# Altium footprint library 电阻封装库.PcbLib: 218 footprints (part 10 of 14)
Each footprint in its own frame and in the unit in brackets; x right, y up, seen from the top. Pads: shape width x height; smd on the part's side, far side on the other; paste and mask are expansions set on the pad; w line width, h text height; cw(c..) or ccw(c..) is an arc to the next point about the centre after c.
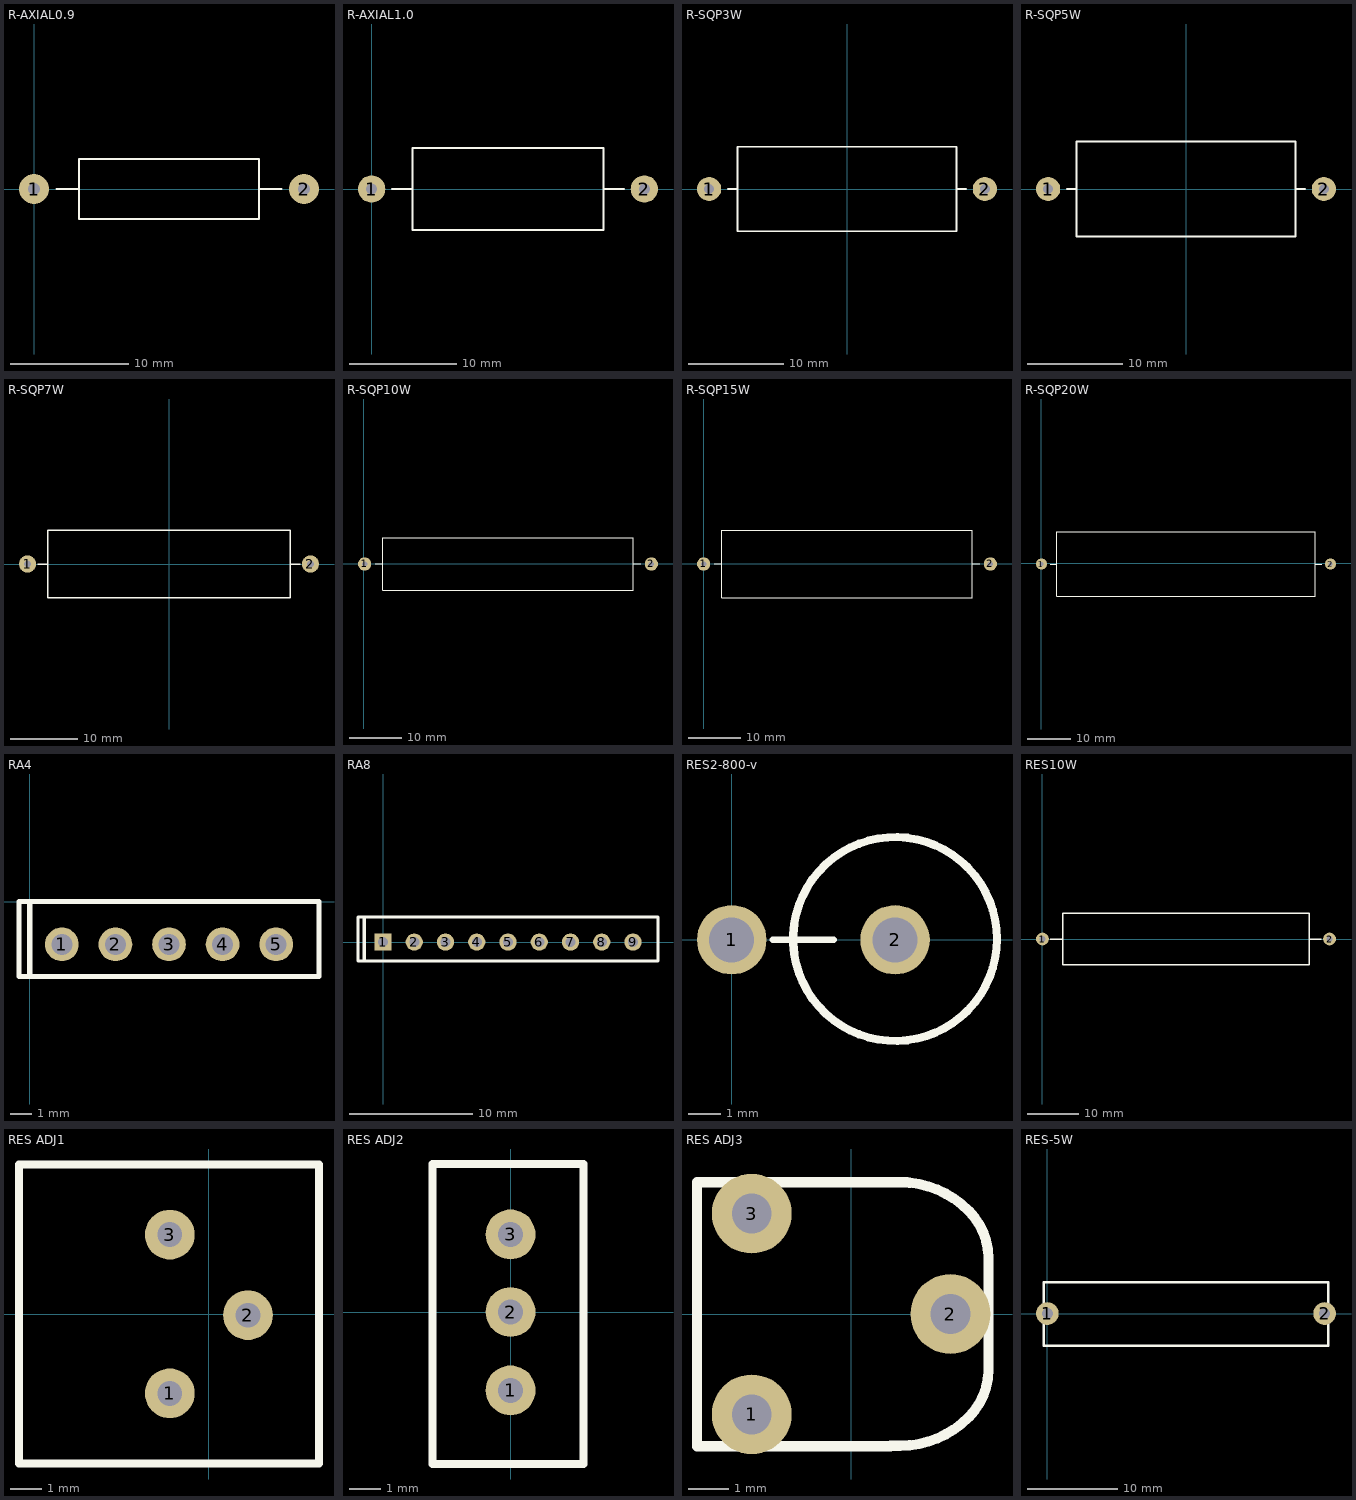
[diagram p9: the footprints below, top view; thin cyan lines are the x and y axes]

## R-AXIAL0.9 [mil]
pads (2):
  round 100 hole 40: 1(0,0) 2(900,0)
Top Overlay:
  lines w8: 75,0 150,0 ; 750,0 825,0 ; 150,-100 150,100 750,100 750,-100 150,-100

## R-AXIAL1.0 [mil]
pads (2):
  round 100 hole 40: 1(0,0) 2(1000,0)
Top Overlay:
  lines w8: 75,0 150,0 ; 850,0 925,0 ; 150,-150 150,150 850,150 850,-150 150,-150

## R-SQP3W [mm]
pads (2):
  round 2.54 hole 1.016: 1(-14.5,0) 2(14.5,0)
Top Overlay:
  lines w0.203: -12.5,0 -11.5,0 ; 11.5,0 12.5,0 ; -11.5,-4.445 11.5,-4.445 11.5,4.445 -11.5,4.445 -11.5,-4.445

## R-SQP5W [mm]
pads (2):
  round 2.54 hole 1.016: 1(-14.5,0) 2(14.5,0)
Top Overlay:
  lines w0.203: -12.5,0 -11.5,0 ; 11.5,0 12.5,0 ; -11.5,-5 -11.5,5 11.5,5 11.5,-5 -11.5,-5

## R-SQP7W [mm]
pads (2):
  round 2.54 hole 1.016: 1(-21,0) 2(21,0)
Top Overlay:
  lines w0.203: -19.5,0 -18,0 ; 18,0 19.5,0 ; -18,-5 18,-5 18,5 -18,5 -18,-5

## R-SQP10W [mil]
pads (2):
  round 100 hole 40: 1(4.82,-2.5) 2(2170.18,-2.5)
Top Overlay:
  lines w8: 83.56,-2.5 142.62,-2.5 ; 2032.38,-2.5 2091.44,-2.5 ; 142.62,-199.35 142.62,194.35 2032.38,194.35 2032.38,-199.35 142.62,-199.35

## R-SQP15W [mil]
pads (2):
  round 100 hole 40: 1(-0.18,-2.5) 2(2165.18,-2.5)
Top Overlay:
  lines w8: 78.56,-2.5 137.62,-2.5 ; 2027.38,-2.5 2086.44,-2.5 ; 137.62,-258.41 137.62,253.41 2027.38,253.41 2027.38,-258.41 137.62,-258.41

## R-SQP20W [mil]
pads (2):
  round 100 hole 40: 1(3.6,-5) 2(2641.4,-5)
Top Overlay:
  lines w8: 82.34,-5 141.4,-5 ; 2503.6,-5 2562.66,-5 ; 141.4,-300.28 141.4,290.28 2503.6,290.28 2503.6,-300.28 141.4,-300.28

## RA4 [mm]
height 0.6
pads (5):
  round 1.6 hole 1: 1(1.524,-2.032) 2(4.064,-2.032) 3(6.604,-2.032) 4(9.144,-2.032) 5(11.684,-2.032)
Top Overlay:
  lines w0.254: 0,-3.556 0,0 ; -0.508,-3.556 13.716,-3.556 13.716,0 -0.508,0 -0.508,-0.508 -0.508,-3.556
3D body "RA4.STEP": height 3.5, standoff -3, extent 0.254,-2.656 12.954,-1.256

## RA8 [mm]
height 0.6
pads (9):
  rect 1.4x1.4 hole 0.813: 1(0,0)
  round 1.4 hole 0.813: 2(2.54,0) 3(5.08,0) 4(7.62,0) 5(10.16,0) 6(12.7,0) 7(15.24,0) 8(17.78,0) 9(20.32,0)
Top Overlay:
  lines w0.254: -1.524,-1.524 -1.524,2.032 ; -2.032,-1.524 22.352,-1.524 22.352,2.032 -2.032,2.032 -2.032,1.524 -2.032,-1.524
3D body "RA8.STEP": height 3.5, standoff -2, extent -1.194,-0.6 21.666,0.6

## RES2-800-v [mil]
pads (2):
  round 85 / inner round 85 / far side round 70 hole 55.12: 1(0,0) 2(200,0)
Top Overlay:
  circle w10: c200,1 r124.78
  lines w8: 50,0 125,0

## RES10W [mm]
pads (2):
  round 2.5 hole 1.2: 1(0,0) 2(56,0)
Top Overlay:
  lines w0.254: 1.524,0 4,0 ; 52,0 54.356,0 ; 4,-5 4,5 52,5 52,-5 4,-5

## RES ADJ1 [mm]
pads (3):
  round 1.6 hole 0.8: 1(-1.257,-2.553) 2(1.257,-0.038) 3(-1.257,2.553)
Top Overlay:
  lines w0.254: -6.109,-4.813 3.543,-4.813 3.543,4.813 -6.109,4.813 -6.109,-4.813
3D body "RES ADJUST.step": height 5, standoff -4.83, extent -6.073,-4.793 3.457,4.737

## RES ADJ2 [mm]
pads (3):
  round 1.6 hole 0.8: 1(0,-2.515) 2(0,0) 3(0,2.489)
Top Overlay:
  lines w0.254: -2.502,-4.877 2.337,-4.877 2.337,4.75 -2.502,4.75 -2.502,-4.877
3D body "3386W.step": height 9.53, standoff -5, extent -2.464,-4.828 2.366,4.701

## RES ADJ3 [mm]
pads (3):
  round 2 hole 1: 1(-2.489,-2.515) 2(2.489,0) 3(-2.489,2.515)
Top Overlay:
  lines w0.254: 0.991,-3.315 -3.861,-3.315 -3.861,3.302 1.397,3.302 ; 0.991,-3.302 1.229,-3.302 ccw(c1.229,-0.874) 2.946,-2.591 ccw(c1.751,-1.395) 3.442,-1.395 3.442,-1.372 ; 0.991,3.302 1.229,3.302 cw(c1.229,0.874) 2.946,2.591 cw(c1.751,1.395) 3.442,1.395 3.442,1.372 ; 3.442,-1.384 3.442,1.384
3D body "PA0630NOXOX-HA1.STEP": height 7.5, standoff -2, extent -3.754,-3.201 3.246,3.199

## RES-5W [mm]
pads (2):
  round 2.5 hole 1.2: 1(0,0) 2(30.582,0)
Top Overlay:
  lines w0.254: -0.406,-3.556 -0.406,3.454 30.988,3.454 30.988,-3.556 -0.406,-3.556
3D body "水泥电阻 5w.s": height 4.35, standoff -6.85, extent -0.349,-3.52 30.931,3.48